# Altium schematic symbol library jlcpcb_2025_04_ferrites_extended_0603.schlib: 833 symbols (part 3 of 4)
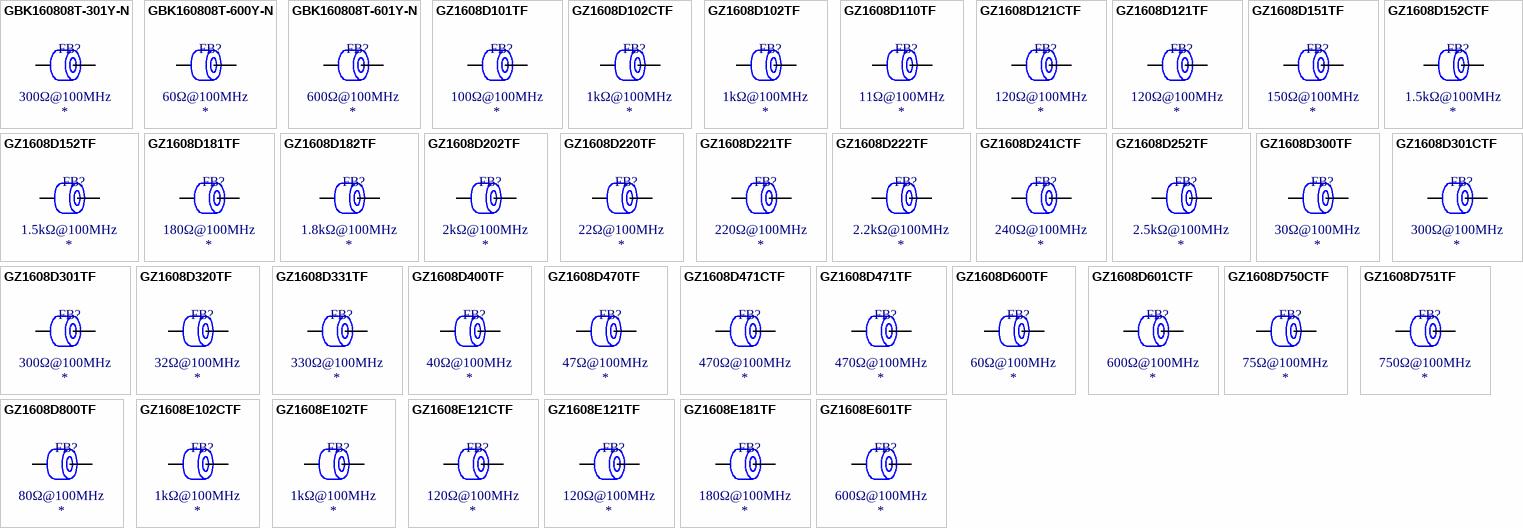
[diagram p22: symbols GBK160808T-301Y-N to GZ1608E601TF]

## GZ1608D182TF
designator FB?  Impedance @ Frequency: 1.8kΩ@100MHz
Ferrite, 1.8kΩ@100MHz, ±25%, 900mΩ, 100mA, SMD 0603; Manufacturer: Sunlord; Manufacturer Part Number: GZ1608D182TF; Package Size: 0603; JLCPCB Basic Part: No; JLCPCB Part Number: C96695; Supplier 1: LCSC; Category: Ferrite Beads; Supplier Part Number 1: C96695; Tolerance: ±25%; Rated Current: 100mA; DC Resistance: 900mΩ; RoHS: Yes; ComponentLink1Description: Datasheet; ComponentLink1URL: https://wmsc.lcsc.com/wmsc/upload/file/pdf/v2/lcsc/2310301640_Sunlord-GZ1608D182TF_C96695.pdf; ComponentLink2Description: JLCPCB Part URL; ComponentLink2URL: https://jlcpcb.com/partdetail/C96695; ComponentLink3Description: LCSC Part URL; ComponentLink3URL: https://lcsc.com/product-detail/Ferrite-Beads_Sunlord-Sunlord-GZ1608D182TF_C96695.html
footprint FB-0603 (0603 (1608M) Ferrite)
pins: 1, 2

## GZ1608D202TF
designator FB?  Impedance @ Frequency: 2kΩ@100MHz
Ferrite, 2kΩ@100MHz, ±25%, 1.2Ω, 100mA, SMD 0603; Manufacturer: Sunlord; Manufacturer Part Number: GZ1608D202TF; Package Size: 0603; JLCPCB Basic Part: No; JLCPCB Part Number: C96696; Supplier 1: LCSC; Category: Ferrite Beads; Supplier Part Number 1: C96696; Tolerance: ±25%; Rated Current: 100mA; DC Resistance: 1.2Ω; RoHS: Yes; ComponentLink1Description: Datasheet; ComponentLink1URL: https://wmsc.lcsc.com/wmsc/upload/file/pdf/v2/lcsc/2310301640_Sunlord-GZ1608D202TF_C96696.pdf; ComponentLink2Description: JLCPCB Part URL; ComponentLink2URL: https://jlcpcb.com/partdetail/C96696; ComponentLink3Description: LCSC Part URL; ComponentLink3URL: https://lcsc.com/product-detail/Ferrite-Beads_Sunlord-Sunlord-GZ1608D202TF_C96696.html
footprint FB-0603 (0603 (1608M) Ferrite)
pins: 1, 2

## GZ1608D220TF
designator FB?  Impedance @ Frequency: 22Ω@100MHz
Ferrite, 22Ω@100MHz, ±25%, SMD 0603; Manufacturer: Sunlord; Manufacturer Part Number: GZ1608D220TF; Package Size: 0603; JLCPCB Basic Part: No; JLCPCB Part Number: C1010; Supplier 1: LCSC; Category: Ferrite Beads; Supplier Part Number 1: C1010; Tolerance: ±25%; RoHS: Yes; ComponentLink1Description: Datasheet; ComponentLink1URL: https://wmsc.lcsc.com/wmsc/upload/file/pdf/v2/lcsc/2310301640_Sunlord-GZ1608D220TF_C1010.pdf; ComponentLink2Description: JLCPCB Part URL; ComponentLink2URL: https://jlcpcb.com/partdetail/C1010; ComponentLink3Description: LCSC Part URL; ComponentLink3URL: https://lcsc.com/product-detail/Ferrite-Beads_Sunlord-Sunlord-GZ1608D220TF_C1010.html
pins: 1, 2

## GZ1608D221TF
designator FB?  Impedance @ Frequency: 220Ω@100MHz
Ferrite, 220Ω@100MHz, ±25%, 300mΩ, 300mA, SMD 0603; Manufacturer: Sunlord; Manufacturer Part Number: GZ1608D221TF; Package Size: 0603; JLCPCB Basic Part: No; JLCPCB Part Number: C66810; Supplier 1: LCSC; Category: Ferrite Beads; Supplier Part Number 1: C66810; Tolerance: ±25%; Rated Current: 300mA; DC Resistance: 300mΩ; RoHS: Yes; ComponentLink1Description: Datasheet; ComponentLink1URL: https://wmsc.lcsc.com/wmsc/upload/file/pdf/v2/lcsc/2310301640_Sunlord-GZ1608D221TF_C66810.pdf; ComponentLink2Description: JLCPCB Part URL; ComponentLink2URL: https://jlcpcb.com/partdetail/C66810; ComponentLink3Description: LCSC Part URL; ComponentLink3URL: https://lcsc.com/product-detail/Ferrite-Beads_Sunlord-Sunlord-GZ1608D221TF_C66810.html
footprint FB-0603 (0603 (1608M) Ferrite)
pins: 1, 2

## GZ1608D222TF
designator FB?  Impedance @ Frequency: 2.2kΩ@100MHz
Ferrite, 2.2kΩ@100MHz, ±25%, 1.2Ω, 100mA, SMD 0603; Manufacturer: Sunlord; Manufacturer Part Number: GZ1608D222TF; Package Size: 0603; JLCPCB Basic Part: No; JLCPCB Part Number: C96697; Supplier 1: LCSC; Category: Ferrite Beads; Supplier Part Number 1: C96697; Tolerance: ±25%; Rated Current: 100mA; DC Resistance: 1.2Ω; RoHS: Yes; ComponentLink1Description: Datasheet; ComponentLink1URL: https://wmsc.lcsc.com/wmsc/upload/file/pdf/v2/lcsc/2310301640_Sunlord-GZ1608D222TF_C96697.pdf; ComponentLink2Description: JLCPCB Part URL; ComponentLink2URL: https://jlcpcb.com/partdetail/C96697; ComponentLink3Description: LCSC Part URL; ComponentLink3URL: https://lcsc.com/product-detail/Ferrite-Beads_Sunlord-Sunlord-GZ1608D222TF_C96697.html
footprint FB-0603 (0603 (1608M) Ferrite)
pins: 1, 2

## GZ1608D241CTF
designator FB?  Impedance @ Frequency: 240Ω@100MHz
Ferrite, 240Ω@100MHz, ±25%, 300mΩ, 500mA, SMD 0603; Manufacturer: Sunlord; Manufacturer Part Number: GZ1608D241CTF; Package Size: 0603; JLCPCB Basic Part: No; JLCPCB Part Number: C361557; Supplier 1: LCSC; Category: Ferrite Beads; Supplier Part Number 1: C361557; Tolerance: ±25%; Rated Current: 500mA; DC Resistance: 300mΩ; RoHS: Yes; ComponentLink1Description: Datasheet; ComponentLink1URL: https://wmsc.lcsc.com/wmsc/upload/file/pdf/v2/lcsc/2310301640_Sunlord-GZ1608D241CTF_C361557.pdf; ComponentLink2Description: JLCPCB Part URL; ComponentLink2URL: https://jlcpcb.com/partdetail/C361557; ComponentLink3Description: LCSC Part URL; ComponentLink3URL: https://lcsc.com/product-detail/Ferrite-Beads_Sunlord-Sunlord-GZ1608D241CTF_C361557.html
footprint FB-0603 (0603 (1608M) Ferrite)
pins: 1, 2

## GZ1608D252TF
designator FB?  Impedance @ Frequency: 2.5kΩ@100MHz
Ferrite, 2.5kΩ@100MHz, 1.2Ω, SMD 0603; Manufacturer: Sunlord; Manufacturer Part Number: GZ1608D252TF; Package Size: 0603; JLCPCB Basic Part: No; JLCPCB Part Number: C369783; Supplier 1: LCSC; Category: Ferrite Beads; Supplier Part Number 1: C369783; DC Resistance: 1.2Ω; RoHS: Yes; ComponentLink1Description: Datasheet; ComponentLink1URL: https://wmsc.lcsc.com/wmsc/upload/file/pdf/v2/lcsc/2310301640_Sunlord-GZ1608D252TF_C369783.pdf; ComponentLink2Description: JLCPCB Part URL; ComponentLink2URL: https://jlcpcb.com/partdetail/C369783; ComponentLink3Description: LCSC Part URL; ComponentLink3URL: https://lcsc.com/product-detail/Ferrite-Beads_Sunlord-Sunlord-GZ1608D252TF_C369783.html
pins: 1, 2

## GZ1608D300TF
designator FB?  Impedance @ Frequency: 30Ω@100MHz
Ferrite, 30Ω@100MHz, ±25%, 50mΩ, 2A, SMD 0603; Manufacturer: Sunlord; Manufacturer Part Number: GZ1608D300TF; Package Size: 0603; JLCPCB Basic Part: No; JLCPCB Part Number: C24821; Supplier 1: LCSC; Category: Ferrite Beads; Supplier Part Number 1: C24821; Tolerance: ±25%; Rated Current: 2A; DC Resistance: 50mΩ; RoHS: Yes; ComponentLink1Description: Datasheet; ComponentLink1URL: https://wmsc.lcsc.com/wmsc/upload/file/pdf/v2/lcsc/2310301640_Sunlord-GZ1608D300TF_C24821.pdf; ComponentLink2Description: JLCPCB Part URL; ComponentLink2URL: https://jlcpcb.com/partdetail/C24821; ComponentLink3Description: LCSC Part URL; ComponentLink3URL: https://lcsc.com/product-detail/Ferrite-Beads_Sunlord-Sunlord-GZ1608D300TF_C24821.html
footprint FB-0603 (0603 (1608M) Ferrite)
pins: 1, 2

## GZ1608D301CTF
designator FB?  Impedance @ Frequency: 300Ω@100MHz
Ferrite, 300Ω@100MHz, ±25%, 350mΩ, 500mA, SMD 0603; Manufacturer: Sunlord; Manufacturer Part Number: GZ1608D301CTF; Package Size: 0603; JLCPCB Basic Part: No; JLCPCB Part Number: C98271; Supplier 1: LCSC; Category: Ferrite Beads; Supplier Part Number 1: C98271; Tolerance: ±25%; Rated Current: 500mA; DC Resistance: 350mΩ; RoHS: Yes; ComponentLink1Description: Datasheet; ComponentLink1URL: https://wmsc.lcsc.com/wmsc/upload/file/pdf/v2/lcsc/2310301640_Sunlord-GZ1608D301CTF_C98271.pdf; ComponentLink2Description: JLCPCB Part URL; ComponentLink2URL: https://jlcpcb.com/partdetail/C98271; ComponentLink3Description: LCSC Part URL; ComponentLink3URL: https://lcsc.com/product-detail/Ferrite-Beads_Sunlord-Sunlord-GZ1608D301CTF_C98271.html
footprint FB-0603 (0603 (1608M) Ferrite)
pins: 1, 2

## GZ1608D301TF
designator FB?  Impedance @ Frequency: 300Ω@100MHz
Ferrite, 300Ω@100MHz, ±25%, 350mΩ, 200mA, SMD 0603; Manufacturer: Sunlord; Manufacturer Part Number: GZ1608D301TF; Package Size: 0603; JLCPCB Basic Part: No; JLCPCB Part Number: C96698; Supplier 1: LCSC; Category: Ferrite Beads; Supplier Part Number 1: C96698; Tolerance: ±25%; Rated Current: 200mA; DC Resistance: 350mΩ; RoHS: Yes; ComponentLink1Description: Datasheet; ComponentLink1URL: https://wmsc.lcsc.com/wmsc/upload/file/pdf/v2/lcsc/2310301640_Sunlord-GZ1608D301TF_C96698.pdf; ComponentLink2Description: JLCPCB Part URL; ComponentLink2URL: https://jlcpcb.com/partdetail/C96698; ComponentLink3Description: LCSC Part URL; ComponentLink3URL: https://lcsc.com/product-detail/Ferrite-Beads_Sunlord-Sunlord-GZ1608D301TF_C96698.html
footprint FB-0603 (0603 (1608M) Ferrite)
pins: 1, 2

## GZ1608D320TF
designator FB?  Impedance @ Frequency: 32Ω@100MHz
Ferrite, 32Ω@100MHz, ±25%, SMD 0603; Manufacturer: Sunlord; Manufacturer Part Number: GZ1608D320TF; Package Size: 0603; JLCPCB Basic Part: No; JLCPCB Part Number: C74331; Supplier 1: LCSC; Category: Ferrite Beads; Supplier Part Number 1: C74331; Tolerance: ±25%; RoHS: Yes; ComponentLink1Description: Datasheet; ComponentLink1URL: https://wmsc.lcsc.com/wmsc/upload/file/pdf/v2/lcsc/2310301640_Sunlord-GZ1608D320TF_C74331.pdf; ComponentLink2Description: JLCPCB Part URL; ComponentLink2URL: https://jlcpcb.com/partdetail/C74331; ComponentLink3Description: LCSC Part URL; ComponentLink3URL: https://lcsc.com/product-detail/Ferrite-Beads_Sunlord-Sunlord-GZ1608D320TF_C74331.html
pins: 1, 2

## GZ1608D331TF
designator FB?  Impedance @ Frequency: 330Ω@100MHz
Ferrite, 330Ω@100MHz, ±25%, SMD 0603; Manufacturer: Sunlord; Manufacturer Part Number: GZ1608D331TF; Package Size: 0603; JLCPCB Basic Part: No; JLCPCB Part Number: C279917; Supplier 1: LCSC; Category: Ferrite Beads; Supplier Part Number 1: C279917; Tolerance: ±25%; RoHS: Yes; ComponentLink1Description: Datasheet; ComponentLink1URL: https://wmsc.lcsc.com/wmsc/upload/file/pdf/v2/lcsc/2310301640_Sunlord-GZ1608D331TF_C279917.pdf; ComponentLink2Description: JLCPCB Part URL; ComponentLink2URL: https://jlcpcb.com/partdetail/C279917; ComponentLink3Description: LCSC Part URL; ComponentLink3URL: https://lcsc.com/product-detail/Ferrite-Beads_Sunlord-Sunlord-GZ1608D331TF_C279917.html
pins: 1, 2

## GZ1608D400TF
designator FB?  Impedance @ Frequency: 40Ω@100MHz
Ferrite, 40Ω@100MHz, ±25%, SMD 0603; Manufacturer: Sunlord; Manufacturer Part Number: GZ1608D400TF; Package Size: 0603; JLCPCB Basic Part: No; JLCPCB Part Number: C919151; Supplier 1: LCSC; Category: Ferrite Beads; Supplier Part Number 1: C919151; Tolerance: ±25%; RoHS: Yes; ComponentLink1Description: Datasheet; ComponentLink1URL: https://wmsc.lcsc.com/wmsc/upload/file/pdf/v2/lcsc/2310301640_Sunlord-GZ1608D400TF_C919151.pdf; ComponentLink2Description: JLCPCB Part URL; ComponentLink2URL: https://jlcpcb.com/partdetail/C919151; ComponentLink3Description: LCSC Part URL; ComponentLink3URL: https://lcsc.com/product-detail/Ferrite-Beads_Sunlord-Sunlord-GZ1608D400TF_C919151.html
pins: 1, 2

## GZ1608D470TF
designator FB?  Impedance @ Frequency: 47Ω@100MHz
Ferrite, 47Ω@100MHz, ±25%, SMD 0603; Manufacturer: Sunlord; Manufacturer Part Number: GZ1608D470TF; Package Size: 0603; JLCPCB Basic Part: No; JLCPCB Part Number: C83207; Supplier 1: LCSC; Category: Ferrite Beads; Supplier Part Number 1: C83207; Tolerance: ±25%; RoHS: Yes; ComponentLink1Description: Datasheet; ComponentLink1URL: https://wmsc.lcsc.com/wmsc/upload/file/pdf/v2/lcsc/2310301640_Sunlord-GZ1608D470TF_C83207.pdf; ComponentLink2Description: JLCPCB Part URL; ComponentLink2URL: https://jlcpcb.com/partdetail/C83207; ComponentLink3Description: LCSC Part URL; ComponentLink3URL: https://lcsc.com/product-detail/Ferrite-Beads_Sunlord-Sunlord-GZ1608D470TF_C83207.html
pins: 1, 2

## GZ1608D471CTF
designator FB?  Impedance @ Frequency: 470Ω@100MHz
Ferrite, 470Ω@100MHz, ±25%, 400mΩ, 500mA, SMD 0603; Manufacturer: Sunlord; Manufacturer Part Number: GZ1608D471CTF; Package Size: 0603; JLCPCB Basic Part: No; JLCPCB Part Number: C98272; Supplier 1: LCSC; Category: Ferrite Beads; Supplier Part Number 1: C98272; Tolerance: ±25%; Rated Current: 500mA; DC Resistance: 400mΩ; RoHS: Yes; ComponentLink1Description: Datasheet; ComponentLink1URL: https://wmsc.lcsc.com/wmsc/upload/file/pdf/v2/lcsc/2310301640_Sunlord-GZ1608D471CTF_C98272.pdf; ComponentLink2Description: JLCPCB Part URL; ComponentLink2URL: https://jlcpcb.com/partdetail/C98272; ComponentLink3Description: LCSC Part URL; ComponentLink3URL: https://lcsc.com/product-detail/Ferrite-Beads_Sunlord-Sunlord-GZ1608D471CTF_C98272.html
footprint FB-0603 (0603 (1608M) Ferrite)
pins: 1, 2

## GZ1608D471TF
designator FB?  Impedance @ Frequency: 470Ω@100MHz
Ferrite, 470Ω@100MHz, ±25%, 450mΩ, 200mA, SMD 0603; Manufacturer: Sunlord; Manufacturer Part Number: GZ1608D471TF; Package Size: 0603; JLCPCB Basic Part: No; JLCPCB Part Number: C89921; Supplier 1: LCSC; Category: Ferrite Beads; Supplier Part Number 1: C89921; Tolerance: ±25%; Rated Current: 200mA; DC Resistance: 450mΩ; RoHS: Yes; ComponentLink1Description: Datasheet; ComponentLink1URL: https://wmsc.lcsc.com/wmsc/upload/file/pdf/v2/lcsc/2310301640_Sunlord-GZ1608D471TF_C89921.pdf; ComponentLink2Description: JLCPCB Part URL; ComponentLink2URL: https://jlcpcb.com/partdetail/C89921; ComponentLink3Description: LCSC Part URL; ComponentLink3URL: https://lcsc.com/product-detail/Ferrite-Beads_Sunlord-Sunlord-GZ1608D471TF_C89921.html
footprint FB-0603 (0603 (1608M) Ferrite)
pins: 1, 2

## GZ1608D600TF
designator FB?  Impedance @ Frequency: 60Ω@100MHz
Ferrite, 60Ω@100MHz, ±25%, 100mΩ, 500mA, SMD 0603; Manufacturer: Sunlord; Manufacturer Part Number: GZ1608D600TF; Package Size: 0603; JLCPCB Basic Part: No; JLCPCB Part Number: C35327; Supplier 1: LCSC; Category: Ferrite Beads; Supplier Part Number 1: C35327; Tolerance: ±25%; Rated Current: 500mA; DC Resistance: 100mΩ; RoHS: Yes; ComponentLink1Description: Datasheet; ComponentLink1URL: https://wmsc.lcsc.com/wmsc/upload/file/pdf/v2/lcsc/2310301640_Sunlord-GZ1608D600TF_C35327.pdf; ComponentLink2Description: JLCPCB Part URL; ComponentLink2URL: https://jlcpcb.com/partdetail/C35327; ComponentLink3Description: LCSC Part URL; ComponentLink3URL: https://lcsc.com/product-detail/Ferrite-Beads_Sunlord-Sunlord-GZ1608D600TF_C35327.html
footprint FB-0603 (0603 (1608M) Ferrite)
pins: 1, 2

## GZ1608D601CTF
designator FB?  Impedance @ Frequency: 600Ω@100MHz
Ferrite, 600Ω@100MHz, ±25%, 400mΩ, 500mA, SMD 0603; Manufacturer: Sunlord; Manufacturer Part Number: GZ1608D601CTF; Package Size: 0603; JLCPCB Basic Part: No; JLCPCB Part Number: C74330; Supplier 1: LCSC; Category: Ferrite Beads; Supplier Part Number 1: C74330; Tolerance: ±25%; Rated Current: 500mA; DC Resistance: 400mΩ; RoHS: Yes; ComponentLink1Description: Datasheet; ComponentLink1URL: https://wmsc.lcsc.com/wmsc/upload/file/pdf/v2/lcsc/2310301640_Sunlord-GZ1608D601CTF_C74330.pdf; ComponentLink2Description: JLCPCB Part URL; ComponentLink2URL: https://jlcpcb.com/partdetail/C74330; ComponentLink3Description: LCSC Part URL; ComponentLink3URL: https://lcsc.com/product-detail/Ferrite-Beads_Sunlord-Sunlord-GZ1608D601CTF_C74330.html
footprint FB-0603 (0603 (1608M) Ferrite)
pins: 1, 2

## GZ1608D750CTF
designator FB?  Impedance @ Frequency: 75Ω@100MHz
Ferrite, 75Ω@100MHz, ±25%, SMD 0603; Manufacturer: Sunlord; Manufacturer Part Number: GZ1608D750CTF; Package Size: 0603; JLCPCB Basic Part: No; JLCPCB Part Number: C279841; Supplier 1: LCSC; Category: Ferrite Beads; Supplier Part Number 1: C279841; Tolerance: ±25%; RoHS: Yes; ComponentLink1Description: Datasheet; ComponentLink1URL: https://wmsc.lcsc.com/wmsc/upload/file/pdf/v2/lcsc/2310301640_Sunlord-GZ1608D750CTF_C279841.pdf; ComponentLink2Description: JLCPCB Part URL; ComponentLink2URL: https://jlcpcb.com/partdetail/C279841; ComponentLink3Description: LCSC Part URL; ComponentLink3URL: https://lcsc.com/product-detail/Ferrite-Beads_Sunlord-Sunlord-GZ1608D750CTF_C279841.html
pins: 1, 2

## GZ1608D751TF
designator FB?  Impedance @ Frequency: 750Ω@100MHz
Ferrite, 750Ω@100MHz, ±25%, 500mΩ, 200mA, SMD 0603; Manufacturer: Sunlord; Manufacturer Part Number: GZ1608D751TF; Package Size: 0603; JLCPCB Basic Part: No; JLCPCB Part Number: C96699; Supplier 1: LCSC; Category: Ferrite Beads; Supplier Part Number 1: C96699; Tolerance: ±25%; Rated Current: 200mA; DC Resistance: 500mΩ; RoHS: Yes; ComponentLink1Description: Datasheet; ComponentLink1URL: https://wmsc.lcsc.com/wmsc/upload/file/pdf/v2/lcsc/2310301640_Sunlord-GZ1608D751TF_C96699.pdf; ComponentLink2Description: JLCPCB Part URL; ComponentLink2URL: https://jlcpcb.com/partdetail/C96699; ComponentLink3Description: LCSC Part URL; ComponentLink3URL: https://lcsc.com/product-detail/Ferrite-Beads_Sunlord-Sunlord-GZ1608D751TF_C96699.html
footprint FB-0603 (0603 (1608M) Ferrite)
pins: 1, 2

## GZ1608D800TF
designator FB?  Impedance @ Frequency: 80Ω@100MHz
Ferrite, 80Ω@100MHz, ±25%, 150mΩ, 400mA, SMD 0603; Manufacturer: Sunlord; Manufacturer Part Number: GZ1608D800TF; Package Size: 0603; JLCPCB Basic Part: No; JLCPCB Part Number: C96700; Supplier 1: LCSC; Category: Ferrite Beads; Supplier Part Number 1: C96700; Tolerance: ±25%; Rated Current: 400mA; DC Resistance: 150mΩ; RoHS: Yes; ComponentLink1Description: Datasheet; ComponentLink1URL: https://wmsc.lcsc.com/wmsc/upload/file/pdf/v2/lcsc/2310301640_Sunlord-GZ1608D800TF_C96700.pdf; ComponentLink2Description: JLCPCB Part URL; ComponentLink2URL: https://jlcpcb.com/partdetail/C96700; ComponentLink3Description: LCSC Part URL; ComponentLink3URL: https://lcsc.com/product-detail/Ferrite-Beads_Sunlord-Sunlord-GZ1608D800TF_C96700.html
footprint FB-0603 (0603 (1608M) Ferrite)
pins: 1, 2

## GZ1608E102CTF
designator FB?  Impedance @ Frequency: 1kΩ@100MHz
Ferrite, 1kΩ@100MHz, ±25%, 500mΩ, 400mA, SMD 0603; Manufacturer: Sunlord; Manufacturer Part Number: GZ1608E102CTF; Package Size: 0603; JLCPCB Basic Part: No; JLCPCB Part Number: C361559; Supplier 1: LCSC; Category: Ferrite Beads; Supplier Part Number 1: C361559; Tolerance: ±25%; Rated Current: 400mA; DC Resistance: 500mΩ; RoHS: Yes; ComponentLink1Description: Datasheet; ComponentLink1URL: https://wmsc.lcsc.com/wmsc/upload/file/pdf/v2/lcsc/2310301640_Sunlord-GZ1608E102CTF_C361559.pdf; ComponentLink2Description: JLCPCB Part URL; ComponentLink2URL: https://jlcpcb.com/partdetail/C361559; ComponentLink3Description: LCSC Part URL; ComponentLink3URL: https://lcsc.com/product-detail/Ferrite-Beads_Sunlord-Sunlord-GZ1608E102CTF_C361559.html
footprint FB-0603 (0603 (1608M) Ferrite)
pins: 1, 2

## GZ1608E102TF
designator FB?  Impedance @ Frequency: 1kΩ@100MHz
Ferrite, 1kΩ@100MHz, ±25%, 600mΩ, 200mA, SMD 0603; Manufacturer: Sunlord; Manufacturer Part Number: GZ1608E102TF; Package Size: 0603; JLCPCB Basic Part: No; JLCPCB Part Number: C361518; Supplier 1: LCSC; Category: Ferrite Beads; Supplier Part Number 1: C361518; Tolerance: ±25%; Rated Current: 200mA; DC Resistance: 600mΩ; RoHS: Yes; ComponentLink1Description: Datasheet; ComponentLink1URL: https://wmsc.lcsc.com/wmsc/upload/file/pdf/v2/lcsc/2310301640_Sunlord-GZ1608E102TF_C361518.pdf; ComponentLink2Description: JLCPCB Part URL; ComponentLink2URL: https://jlcpcb.com/partdetail/C361518; ComponentLink3Description: LCSC Part URL; ComponentLink3URL: https://lcsc.com/product-detail/Ferrite-Beads_Sunlord-Sunlord-GZ1608E102TF_C361518.html
footprint FB-0603 (0603 (1608M) Ferrite)
pins: 1, 2

## GZ1608E121CTF
designator FB?  Impedance @ Frequency: 120Ω@100MHz
Ferrite, 120Ω@100MHz, ±25%, 200mΩ, 500mA, SMD 0603; Manufacturer: Sunlord; Manufacturer Part Number: GZ1608E121CTF; Package Size: 0603; JLCPCB Basic Part: No; JLCPCB Part Number: C361558; Supplier 1: LCSC; Category: Ferrite Beads; Supplier Part Number 1: C361558; Tolerance: ±25%; Rated Current: 500mA; DC Resistance: 200mΩ; RoHS: Yes; ComponentLink1Description: Datasheet; ComponentLink1URL: https://wmsc.lcsc.com/wmsc/upload/file/pdf/v2/lcsc/2310301640_Sunlord-GZ1608E121CTF_C361558.pdf; ComponentLink2Description: JLCPCB Part URL; ComponentLink2URL: https://jlcpcb.com/partdetail/C361558; ComponentLink3Description: LCSC Part URL; ComponentLink3URL: https://lcsc.com/product-detail/Ferrite-Beads_Sunlord-Sunlord-GZ1608E121CTF_C361558.html
footprint FB-0603 (0603 (1608M) Ferrite)
pins: 1, 2

## GZ1608E121TF
designator FB?  Impedance @ Frequency: 120Ω@100MHz
Ferrite, 120Ω@100MHz, ±25%, 200mΩ, 300mA, SMD 0603; Manufacturer: Sunlord; Manufacturer Part Number: GZ1608E121TF; Package Size: 0603; JLCPCB Basic Part: No; JLCPCB Part Number: C98265; Supplier 1: LCSC; Category: Ferrite Beads; Supplier Part Number 1: C98265; Tolerance: ±25%; Rated Current: 300mA; DC Resistance: 200mΩ; RoHS: Yes; ComponentLink1Description: Datasheet; ComponentLink1URL: https://wmsc.lcsc.com/wmsc/upload/file/pdf/v2/lcsc/2310301640_Sunlord-GZ1608E121TF_C98265.pdf; ComponentLink2Description: JLCPCB Part URL; ComponentLink2URL: https://jlcpcb.com/partdetail/C98265; ComponentLink3Description: LCSC Part URL; ComponentLink3URL: https://lcsc.com/product-detail/Ferrite-Beads_Sunlord-Sunlord-GZ1608E121TF_C98265.html
footprint FB-0603 (0603 (1608M) Ferrite)
pins: 1, 2

## GZ1608E181TF
designator FB?  Impedance @ Frequency: 180Ω@100MHz
Ferrite, 180Ω@100MHz, ±25%, 300mΩ, 300mA, SMD 0603; Manufacturer: Sunlord; Manufacturer Part Number: GZ1608E181TF; Package Size: 0603; JLCPCB Basic Part: No; JLCPCB Part Number: C279915; Supplier 1: LCSC; Category: Ferrite Beads; Supplier Part Number 1: C279915; Tolerance: ±25%; Rated Current: 300mA; DC Resistance: 300mΩ; RoHS: Yes; ComponentLink1Description: Datasheet; ComponentLink1URL: https://wmsc.lcsc.com/wmsc/upload/file/pdf/v2/lcsc/2310301640_Sunlord-GZ1608E181TF_C279915.pdf; ComponentLink2Description: JLCPCB Part URL; ComponentLink2URL: https://jlcpcb.com/partdetail/C279915; ComponentLink3Description: LCSC Part URL; ComponentLink3URL: https://lcsc.com/product-detail/Ferrite-Beads_Sunlord-Sunlord-GZ1608E181TF_C279915.html
footprint FB-0603 (0603 (1608M) Ferrite)
pins: 1, 2

## GZ1608E601TF
designator FB?  Impedance @ Frequency: 600Ω@100MHz
Ferrite, 600Ω@100MHz, ±25%, 450mΩ, 200mA, SMD 0603; Manufacturer: Sunlord; Manufacturer Part Number: GZ1608E601TF; Package Size: 0603; JLCPCB Basic Part: No; JLCPCB Part Number: C361517; Supplier 1: LCSC; Category: Ferrite Beads; Supplier Part Number 1: C361517; Tolerance: ±25%; Rated Current: 200mA; DC Resistance: 450mΩ; RoHS: Yes; ComponentLink1Description: Datasheet; ComponentLink1URL: https://wmsc.lcsc.com/wmsc/upload/file/pdf/v2/lcsc/2310301640_Sunlord-GZ1608E601TF_C361517.pdf; ComponentLink2Description: JLCPCB Part URL; ComponentLink2URL: https://jlcpcb.com/partdetail/C361517; ComponentLink3Description: LCSC Part URL; ComponentLink3URL: https://lcsc.com/product-detail/Ferrite-Beads_Sunlord-Sunlord-GZ1608E601TF_C361517.html
footprint FB-0603 (0603 (1608M) Ferrite)
pins: 1, 2

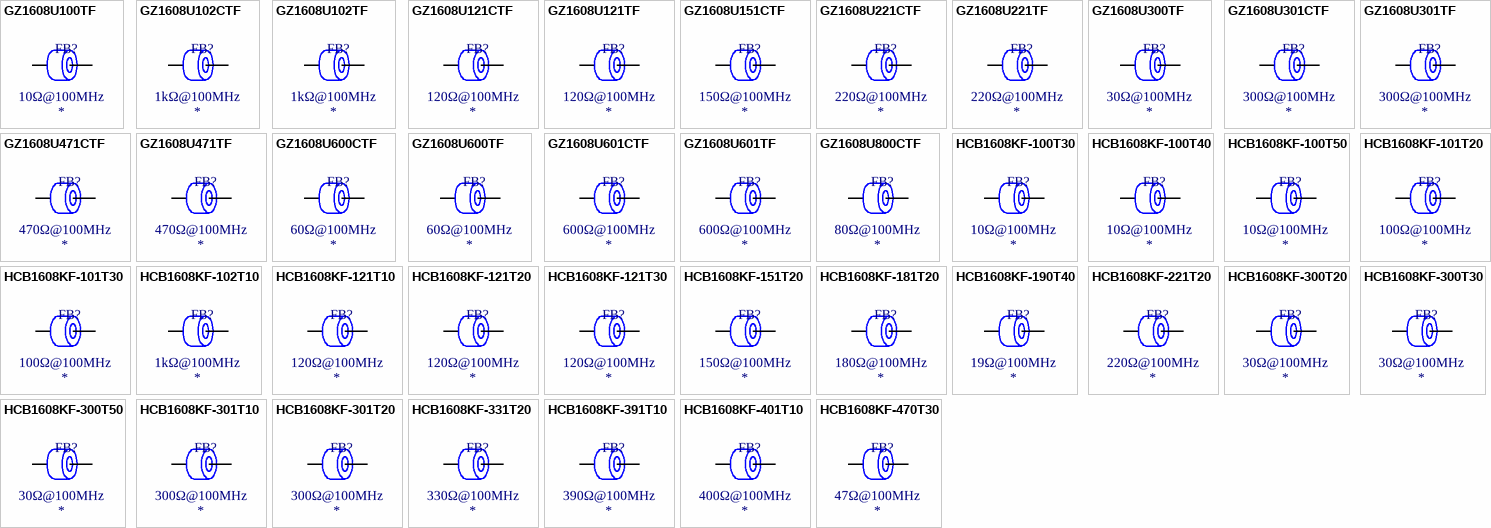
[diagram p11: symbols GZ1608U100TF to HCB1608KF-470T30]

## GZ1608U100TF
designator FB?  Impedance @ Frequency: 10Ω@100MHz
Ferrite, 10Ω@100MHz, 50mΩ, 2A, SMD 0603; Manufacturer: Sunlord; Manufacturer Part Number: GZ1608U100TF; Package Size: 0603; JLCPCB Basic Part: No; JLCPCB Part Number: C361519; Supplier 1: LCSC; Category: Ferrite Beads; Supplier Part Number 1: C361519; Rated Current: 2A; DC Resistance: 50mΩ; RoHS: Yes; ComponentLink1Description: Datasheet; ComponentLink1URL: https://wmsc.lcsc.com/wmsc/upload/file/pdf/v2/lcsc/2310301640_Sunlord-GZ1608U100TF_C361519.pdf; ComponentLink2Description: JLCPCB Part URL; ComponentLink2URL: https://jlcpcb.com/partdetail/C361519; ComponentLink3Description: LCSC Part URL; ComponentLink3URL: https://lcsc.com/product-detail/Ferrite-Beads_Sunlord-Sunlord-GZ1608U100TF_C361519.html
pins: 1, 2

## GZ1608U102CTF
designator FB?  Impedance @ Frequency: 1kΩ@100MHz
Ferrite, 1kΩ@100MHz, ±25%, 500mΩ, 400mA, SMD 0603; Manufacturer: Sunlord; Manufacturer Part Number: GZ1608U102CTF; Package Size: 0603; JLCPCB Basic Part: No; JLCPCB Part Number: C96701; Supplier 1: LCSC; Category: Ferrite Beads; Supplier Part Number 1: C96701; Tolerance: ±25%; Rated Current: 400mA; DC Resistance: 500mΩ; RoHS: Yes; ComponentLink1Description: Datasheet; ComponentLink1URL: https://wmsc.lcsc.com/wmsc/upload/file/pdf/v2/lcsc/2310301640_Sunlord-GZ1608U102CTF_C96701.pdf; ComponentLink2Description: JLCPCB Part URL; ComponentLink2URL: https://jlcpcb.com/partdetail/C96701; ComponentLink3Description: LCSC Part URL; ComponentLink3URL: https://lcsc.com/product-detail/Ferrite-Beads_Sunlord-Sunlord-GZ1608U102CTF_C96701.html
footprint FB-0603 (0603 (1608M) Ferrite)
pins: 1, 2

## GZ1608U102TF
designator FB?  Impedance @ Frequency: 1kΩ@100MHz
Ferrite, 1kΩ@100MHz, ±25%, 600mΩ, 200mA, SMD 0603; Manufacturer: Sunlord; Manufacturer Part Number: GZ1608U102TF; Package Size: 0603; JLCPCB Basic Part: No; JLCPCB Part Number: C279903; Supplier 1: LCSC; Category: Ferrite Beads; Supplier Part Number 1: C279903; Tolerance: ±25%; Rated Current: 200mA; DC Resistance: 600mΩ; RoHS: Yes; ComponentLink1Description: Datasheet; ComponentLink1URL: https://wmsc.lcsc.com/wmsc/upload/file/pdf/v2/lcsc/2310301640_Sunlord-GZ1608U102TF_C279903.pdf; ComponentLink2Description: JLCPCB Part URL; ComponentLink2URL: https://jlcpcb.com/partdetail/C279903; ComponentLink3Description: LCSC Part URL; ComponentLink3URL: https://lcsc.com/product-detail/Ferrite-Beads_Sunlord-Sunlord-GZ1608U102TF_C279903.html
footprint FB-0603 (0603 (1608M) Ferrite)
pins: 1, 2

## GZ1608U121CTF
designator FB?  Impedance @ Frequency: 120Ω@100MHz
Ferrite, 120Ω@100MHz, ±25%, 180mΩ, 500mA, SMD 0603; Manufacturer: Sunlord; Manufacturer Part Number: GZ1608U121CTF; Package Size: 0603; JLCPCB Basic Part: No; JLCPCB Part Number: C96702; Supplier 1: LCSC; Category: Ferrite Beads; Supplier Part Number 1: C96702; Tolerance: ±25%; Rated Current: 500mA; DC Resistance: 180mΩ; RoHS: Yes; ComponentLink1Description: Datasheet; ComponentLink1URL: https://wmsc.lcsc.com/wmsc/upload/file/pdf/v2/lcsc/2310301640_Sunlord-GZ1608U121CTF_C96702.pdf; ComponentLink2Description: JLCPCB Part URL; ComponentLink2URL: https://jlcpcb.com/partdetail/C96702; ComponentLink3Description: LCSC Part URL; ComponentLink3URL: https://lcsc.com/product-detail/Ferrite-Beads_Sunlord-Sunlord-GZ1608U121CTF_C96702.html
footprint FB-0603 (0603 (1608M) Ferrite)
pins: 1, 2

## GZ1608U121TF
designator FB?  Impedance @ Frequency: 120Ω@100MHz
Ferrite, 120Ω@100MHz, ±25%, 200mΩ, 300mA, SMD 0603; Manufacturer: Sunlord; Manufacturer Part Number: GZ1608U121TF; Package Size: 0603; JLCPCB Basic Part: No; JLCPCB Part Number: C304309; Supplier 1: LCSC; Category: Ferrite Beads; Supplier Part Number 1: C304309; Tolerance: ±25%; Rated Current: 300mA; DC Resistance: 200mΩ; RoHS: Yes; ComponentLink1Description: Datasheet; ComponentLink1URL: https://wmsc.lcsc.com/wmsc/upload/file/pdf/v2/lcsc/2310301640_Sunlord-GZ1608U121TF_C304309.pdf; ComponentLink2Description: JLCPCB Part URL; ComponentLink2URL: https://jlcpcb.com/partdetail/C304309; ComponentLink3Description: LCSC Part URL; ComponentLink3URL: https://lcsc.com/product-detail/Ferrite-Beads_Sunlord-Sunlord-GZ1608U121TF_C304309.html
footprint FB-0603 (0603 (1608M) Ferrite)
pins: 1, 2

## GZ1608U151CTF
designator FB?  Impedance @ Frequency: 150Ω@100MHz
Ferrite, 150Ω@100MHz, ±25%, 250mΩ, 500mA, SMD 0603; Manufacturer: Sunlord; Manufacturer Part Number: GZ1608U151CTF; Package Size: 0603; JLCPCB Basic Part: No; JLCPCB Part Number: C96703; Supplier 1: LCSC; Category: Ferrite Beads; Supplier Part Number 1: C96703; Tolerance: ±25%; Rated Current: 500mA; DC Resistance: 250mΩ; RoHS: Yes; ComponentLink1Description: Datasheet; ComponentLink1URL: https://wmsc.lcsc.com/wmsc/upload/file/pdf/v2/lcsc/2310301640_Sunlord-GZ1608U151CTF_C96703.pdf; ComponentLink2Description: JLCPCB Part URL; ComponentLink2URL: https://jlcpcb.com/partdetail/C96703; ComponentLink3Description: LCSC Part URL; ComponentLink3URL: https://lcsc.com/product-detail/Ferrite-Beads_Sunlord-Sunlord-GZ1608U151CTF_C96703.html
footprint FB-0603 (0603 (1608M) Ferrite)
pins: 1, 2

## GZ1608U221CTF
designator FB?  Impedance @ Frequency: 220Ω@100MHz
Ferrite, 220Ω@100MHz, ±25%, 250mΩ, 500mA, SMD 0603; Manufacturer: Sunlord; Manufacturer Part Number: GZ1608U221CTF; Package Size: 0603; JLCPCB Basic Part: No; JLCPCB Part Number: C96704; Supplier 1: LCSC; Category: Ferrite Beads; Supplier Part Number 1: C96704; Tolerance: ±25%; Rated Current: 500mA; DC Resistance: 250mΩ; RoHS: Yes; ComponentLink1Description: Datasheet; ComponentLink1URL: https://wmsc.lcsc.com/wmsc/upload/file/pdf/v2/lcsc/2310301640_Sunlord-GZ1608U221CTF_C96704.pdf; ComponentLink2Description: JLCPCB Part URL; ComponentLink2URL: https://jlcpcb.com/partdetail/C96704; ComponentLink3Description: LCSC Part URL; ComponentLink3URL: https://lcsc.com/product-detail/Ferrite-Beads_Sunlord-Sunlord-GZ1608U221CTF_C96704.html
footprint FB-0603 (0603 (1608M) Ferrite)
pins: 1, 2

## GZ1608U221TF
designator FB?  Impedance @ Frequency: 220Ω@100MHz
Ferrite, 220Ω@100MHz, ±25%, 300mΩ, 300mA, SMD 0603; Manufacturer: Sunlord; Manufacturer Part Number: GZ1608U221TF; Package Size: 0603; JLCPCB Basic Part: No; JLCPCB Part Number: C304310; Supplier 1: LCSC; Category: Ferrite Beads; Supplier Part Number 1: C304310; Tolerance: ±25%; Rated Current: 300mA; DC Resistance: 300mΩ; RoHS: Yes; ComponentLink1Description: Datasheet; ComponentLink1URL: https://wmsc.lcsc.com/wmsc/upload/file/pdf/v2/lcsc/2310301640_Sunlord-GZ1608U221TF_C304310.pdf; ComponentLink2Description: JLCPCB Part URL; ComponentLink2URL: https://jlcpcb.com/partdetail/C304310; ComponentLink3Description: LCSC Part URL; ComponentLink3URL: https://lcsc.com/product-detail/Ferrite-Beads_Sunlord-Sunlord-GZ1608U221TF_C304310.html
footprint FB-0603 (0603 (1608M) Ferrite)
pins: 1, 2

## GZ1608U300TF
designator FB?  Impedance @ Frequency: 30Ω@100MHz
Ferrite, 30Ω@100MHz, ±25%, 50mΩ, 2A, SMD 0603; Manufacturer: Sunlord; Manufacturer Part Number: GZ1608U300TF; Package Size: 0603; JLCPCB Basic Part: No; JLCPCB Part Number: C361520; Supplier 1: LCSC; Category: Ferrite Beads; Supplier Part Number 1: C361520; Tolerance: ±25%; Rated Current: 2A; DC Resistance: 50mΩ; RoHS: Yes; ComponentLink1Description: Datasheet; ComponentLink1URL: https://wmsc.lcsc.com/wmsc/upload/file/pdf/v2/lcsc/2310301640_Sunlord-GZ1608U300TF_C361520.pdf; ComponentLink2Description: JLCPCB Part URL; ComponentLink2URL: https://jlcpcb.com/partdetail/C361520; ComponentLink3Description: LCSC Part URL; ComponentLink3URL: https://lcsc.com/product-detail/Ferrite-Beads_Sunlord-Sunlord-GZ1608U300TF_C361520.html
footprint FB-0603 (0603 (1608M) Ferrite)
pins: 1, 2

## GZ1608U301CTF
designator FB?  Impedance @ Frequency: 300Ω@100MHz
Ferrite, 300Ω@100MHz, ±25%, 250mΩ, 500mA, SMD 0603; Manufacturer: Sunlord; Manufacturer Part Number: GZ1608U301CTF; Package Size: 0603; JLCPCB Basic Part: No; JLCPCB Part Number: C96705; Supplier 1: LCSC; Category: Ferrite Beads; Supplier Part Number 1: C96705; Tolerance: ±25%; Rated Current: 500mA; DC Resistance: 250mΩ; RoHS: Yes; ComponentLink1Description: Datasheet; ComponentLink1URL: https://wmsc.lcsc.com/wmsc/upload/file/pdf/v2/lcsc/2310301640_Sunlord-GZ1608U301CTF_C96705.pdf; ComponentLink2Description: JLCPCB Part URL; ComponentLink2URL: https://jlcpcb.com/partdetail/C96705; ComponentLink3Description: LCSC Part URL; ComponentLink3URL: https://lcsc.com/product-detail/Ferrite-Beads_Sunlord-Sunlord-GZ1608U301CTF_C96705.html
footprint FB-0603 (0603 (1608M) Ferrite)
pins: 1, 2

## GZ1608U301TF
designator FB?  Impedance @ Frequency: 300Ω@100MHz
Ferrite, 300Ω@100MHz, ±25%, 350mΩ, 200mA, SMD 0603; Manufacturer: Sunlord; Manufacturer Part Number: GZ1608U301TF; Package Size: 0603; JLCPCB Basic Part: No; JLCPCB Part Number: C361522; Supplier 1: LCSC; Category: Ferrite Beads; Supplier Part Number 1: C361522; Tolerance: ±25%; Rated Current: 200mA; DC Resistance: 350mΩ; RoHS: Yes; ComponentLink1Description: Datasheet; ComponentLink1URL: https://wmsc.lcsc.com/wmsc/upload/file/pdf/v2/lcsc/2310301640_Sunlord-GZ1608U301TF_C361522.pdf; ComponentLink2Description: JLCPCB Part URL; ComponentLink2URL: https://jlcpcb.com/partdetail/C361522; ComponentLink3Description: LCSC Part URL; ComponentLink3URL: https://lcsc.com/product-detail/Ferrite-Beads_Sunlord-Sunlord-GZ1608U301TF_C361522.html
footprint FB-0603 (0603 (1608M) Ferrite)
pins: 1, 2

## GZ1608U471CTF
designator FB?  Impedance @ Frequency: 470Ω@100MHz
Ferrite, 470Ω@100MHz, ±25%, 350mΩ, 500mA, SMD 0603; Manufacturer: Sunlord; Manufacturer Part Number: GZ1608U471CTF; Package Size: 0603; JLCPCB Basic Part: No; JLCPCB Part Number: C96706; Supplier 1: LCSC; Category: Ferrite Beads; Supplier Part Number 1: C96706; Tolerance: ±25%; Rated Current: 500mA; DC Resistance: 350mΩ; RoHS: Yes; ComponentLink1Description: Datasheet; ComponentLink1URL: https://wmsc.lcsc.com/wmsc/upload/file/pdf/v2/lcsc/2310301640_Sunlord-GZ1608U471CTF_C96706.pdf; ComponentLink2Description: JLCPCB Part URL; ComponentLink2URL: https://jlcpcb.com/partdetail/C96706; ComponentLink3Description: LCSC Part URL; ComponentLink3URL: https://lcsc.com/product-detail/Ferrite-Beads_Sunlord-Sunlord-GZ1608U471CTF_C96706.html
footprint FB-0603 (0603 (1608M) Ferrite)
pins: 1, 2

## GZ1608U471TF
designator FB?  Impedance @ Frequency: 470Ω@100MHz
Ferrite, 470Ω@100MHz, ±25%, 400mΩ, 200mA, SMD 0603; Manufacturer: Sunlord; Manufacturer Part Number: GZ1608U471TF; Package Size: 0603; JLCPCB Basic Part: No; JLCPCB Part Number: C361523; Supplier 1: LCSC; Category: Ferrite Beads; Supplier Part Number 1: C361523; Tolerance: ±25%; Rated Current: 200mA; DC Resistance: 400mΩ; RoHS: Yes; ComponentLink1Description: Datasheet; ComponentLink1URL: https://wmsc.lcsc.com/wmsc/upload/file/pdf/v2/lcsc/2310301640_Sunlord-GZ1608U471TF_C361523.pdf; ComponentLink2Description: JLCPCB Part URL; ComponentLink2URL: https://jlcpcb.com/partdetail/C361523; ComponentLink3Description: LCSC Part URL; ComponentLink3URL: https://lcsc.com/product-detail/Ferrite-Beads_Sunlord-Sunlord-GZ1608U471TF_C361523.html
footprint FB-0603 (0603 (1608M) Ferrite)
pins: 1, 2

## GZ1608U600CTF
designator FB?  Impedance @ Frequency: 60Ω@100MHz
Ferrite, 60Ω@100MHz, ±25%, 100mΩ, 800mA, SMD 0603; Manufacturer: Sunlord; Manufacturer Part Number: GZ1608U600CTF; Package Size: 0603; JLCPCB Basic Part: No; JLCPCB Part Number: C96707; Supplier 1: LCSC; Category: Ferrite Beads; Supplier Part Number 1: C96707; Tolerance: ±25%; Rated Current: 800mA; DC Resistance: 100mΩ; RoHS: Yes; ComponentLink1Description: Datasheet; ComponentLink1URL: https://wmsc.lcsc.com/wmsc/upload/file/pdf/v2/lcsc/2310301640_Sunlord-GZ1608U600CTF_C96707.pdf; ComponentLink2Description: JLCPCB Part URL; ComponentLink2URL: https://jlcpcb.com/partdetail/C96707; ComponentLink3Description: LCSC Part URL; ComponentLink3URL: https://lcsc.com/product-detail/Ferrite-Beads_Sunlord-Sunlord-GZ1608U600CTF_C96707.html
footprint FB-0603 (0603 (1608M) Ferrite)
pins: 1, 2

## GZ1608U600TF
designator FB?  Impedance @ Frequency: 60Ω@100MHz
Ferrite, 60Ω@100MHz, ±25%, 100mΩ, 500mA, SMD 0603; Manufacturer: Sunlord; Manufacturer Part Number: GZ1608U600TF; Package Size: 0603; JLCPCB Basic Part: No; JLCPCB Part Number: C361521; Supplier 1: LCSC; Category: Ferrite Beads; Supplier Part Number 1: C361521; Tolerance: ±25%; Rated Current: 500mA; DC Resistance: 100mΩ; RoHS: Yes; ComponentLink1Description: Datasheet; ComponentLink1URL: https://wmsc.lcsc.com/wmsc/upload/file/pdf/v2/lcsc/2310301640_Sunlord-GZ1608U600TF_C361521.pdf; ComponentLink2Description: JLCPCB Part URL; ComponentLink2URL: https://jlcpcb.com/partdetail/C361521; ComponentLink3Description: LCSC Part URL; ComponentLink3URL: https://lcsc.com/product-detail/Ferrite-Beads_Sunlord-Sunlord-GZ1608U600TF_C361521.html
footprint FB-0603 (0603 (1608M) Ferrite)
pins: 1, 2

## GZ1608U601CTF
designator FB?  Impedance @ Frequency: 600Ω@100MHz
Ferrite, 600Ω@100MHz, ±25%, 380mΩ, 500mA, SMD 0603; Manufacturer: Sunlord; Manufacturer Part Number: GZ1608U601CTF; Package Size: 0603; JLCPCB Basic Part: No; JLCPCB Part Number: C96708; Supplier 1: LCSC; Category: Ferrite Beads; Supplier Part Number 1: C96708; Tolerance: ±25%; Rated Current: 500mA; DC Resistance: 380mΩ; RoHS: Yes; ComponentLink1Description: Datasheet; ComponentLink1URL: https://wmsc.lcsc.com/wmsc/upload/file/pdf/v2/lcsc/2310301640_Sunlord-GZ1608U601CTF_C96708.pdf; ComponentLink2Description: JLCPCB Part URL; ComponentLink2URL: https://jlcpcb.com/partdetail/C96708; ComponentLink3Description: LCSC Part URL; ComponentLink3URL: https://lcsc.com/product-detail/Ferrite-Beads_Sunlord-Sunlord-GZ1608U601CTF_C96708.html
footprint FB-0603 (0603 (1608M) Ferrite)
pins: 1, 2

## GZ1608U601TF
designator FB?  Impedance @ Frequency: 600Ω@100MHz
Ferrite, 600Ω@100MHz, ±25%, 500mΩ, 200mA, SMD 0603; Manufacturer: Sunlord; Manufacturer Part Number: GZ1608U601TF; Package Size: 0603; JLCPCB Basic Part: No; JLCPCB Part Number: C361524; Supplier 1: LCSC; Category: Ferrite Beads; Supplier Part Number 1: C361524; Tolerance: ±25%; Rated Current: 200mA; DC Resistance: 500mΩ; RoHS: Yes; ComponentLink1Description: Datasheet; ComponentLink1URL: https://wmsc.lcsc.com/wmsc/upload/file/pdf/v2/lcsc/2310301640_Sunlord-GZ1608U601TF_C361524.pdf; ComponentLink2Description: JLCPCB Part URL; ComponentLink2URL: https://jlcpcb.com/partdetail/C361524; ComponentLink3Description: LCSC Part URL; ComponentLink3URL: https://lcsc.com/product-detail/Ferrite-Beads_Sunlord-Sunlord-GZ1608U601TF_C361524.html
footprint FB-0603 (0603 (1608M) Ferrite)
pins: 1, 2

## GZ1608U800CTF
designator FB?  Impedance @ Frequency: 80Ω@100MHz
Ferrite, 80Ω@100MHz, ±25%, 100mΩ, 600mA, SMD 0603; Manufacturer: Sunlord; Manufacturer Part Number: GZ1608U800CTF; Package Size: 0603; JLCPCB Basic Part: No; JLCPCB Part Number: C96709; Supplier 1: LCSC; Category: Ferrite Beads; Supplier Part Number 1: C96709; Tolerance: ±25%; Rated Current: 600mA; DC Resistance: 100mΩ; RoHS: Yes; ComponentLink1Description: Datasheet; ComponentLink1URL: https://wmsc.lcsc.com/wmsc/upload/file/pdf/v2/lcsc/2310301640_Sunlord-GZ1608U800CTF_C96709.pdf; ComponentLink2Description: JLCPCB Part URL; ComponentLink2URL: https://jlcpcb.com/partdetail/C96709; ComponentLink3Description: LCSC Part URL; ComponentLink3URL: https://lcsc.com/product-detail/Ferrite-Beads_Sunlord-Sunlord-GZ1608U800CTF_C96709.html
footprint FB-0603 (0603 (1608M) Ferrite)
pins: 1, 2

## HCB1608KF-100T30
designator FB?  Impedance @ Frequency: 10Ω@100MHz
Ferrite, 10Ω@100MHz, ±25%, 40mΩ, 3A, SMD 0603; Manufacturer: TAI-TECH; Manufacturer Part Number: HCB1608KF-100T30; Package Size: 0603; JLCPCB Basic Part: No; JLCPCB Part Number: C369510; Supplier 1: LCSC; Category: Ferrite Beads; Supplier Part Number 1: C369510; Tolerance: ±25%; Rated Current: 3A; DC Resistance: 40mΩ; RoHS: Yes; ComponentLink1Description: Datasheet; ComponentLink1URL: https://wmsc.lcsc.com/wmsc/upload/file/pdf/v2/lcsc/2009171441_TAI-TECH-HCB1608KF-100T30_C369510.pdf; ComponentLink2Description: JLCPCB Part URL; ComponentLink2URL: https://jlcpcb.com/partdetail/C369510; ComponentLink3Description: LCSC Part URL; ComponentLink3URL: https://lcsc.com/product-detail/Ferrite-Beads_TAI-TECH-TAI-TECH-HCB1608KF-100T30_C369510.html
footprint FB-0603 (0603 (1608M) Ferrite)
pins: 1, 2

## HCB1608KF-100T40
designator FB?  Impedance @ Frequency: 10Ω@100MHz
Ferrite, 10Ω@100MHz, ±25%, 30mΩ, 4A, SMD 0603; Manufacturer: TAI-TECH; Manufacturer Part Number: HCB1608KF-100T40; Package Size: 0603; JLCPCB Basic Part: No; JLCPCB Part Number: C369511; Supplier 1: LCSC; Category: Ferrite Beads; Supplier Part Number 1: C369511; Tolerance: ±25%; Rated Current: 4A; DC Resistance: 30mΩ; RoHS: Yes; ComponentLink1Description: Datasheet; ComponentLink1URL: https://wmsc.lcsc.com/wmsc/upload/file/pdf/v2/lcsc/2009171441_TAI-TECH-HCB1608KF-100T40_C369511.pdf; ComponentLink2Description: JLCPCB Part URL; ComponentLink2URL: https://jlcpcb.com/partdetail/C369511; ComponentLink3Description: LCSC Part URL; ComponentLink3URL: https://lcsc.com/product-detail/Ferrite-Beads_TAI-TECH-TAI-TECH-HCB1608KF-100T40_C369511.html
footprint FB-0603 (0603 (1608M) Ferrite)
pins: 1, 2

## HCB1608KF-100T50
designator FB?  Impedance @ Frequency: 10Ω@100MHz
Ferrite, 10Ω@100MHz, ±25%, 20mΩ, 5A, SMD 0603; Manufacturer: TAI-TECH; Manufacturer Part Number: HCB1608KF-100T50; Package Size: 0603; JLCPCB Basic Part: No; JLCPCB Part Number: C356963; Supplier 1: LCSC; Category: Ferrite Beads; Supplier Part Number 1: C356963; Tolerance: ±25%; Rated Current: 5A; DC Resistance: 20mΩ; RoHS: Yes; ComponentLink1Description: Datasheet; ComponentLink1URL: https://wmsc.lcsc.com/wmsc/upload/file/pdf/v2/lcsc/2009171138_TAI-TECH-HCB1608KF-100T50_C356963.pdf; ComponentLink2Description: JLCPCB Part URL; ComponentLink2URL: https://jlcpcb.com/partdetail/C356963; ComponentLink3Description: LCSC Part URL; ComponentLink3URL: https://lcsc.com/product-detail/Ferrite-Beads_TAI-TECH-TAI-TECH-HCB1608KF-100T50_C356963.html
footprint FB-0603 (0603 (1608M) Ferrite)
pins: 1, 2

## HCB1608KF-101T20
designator FB?  Impedance @ Frequency: 100Ω@100MHz
Ferrite, 100Ω@100MHz, ±25%, 200mΩ, 2A, SMD 0603; Manufacturer: TAI-TECH; Manufacturer Part Number: HCB1608KF-101T20; Package Size: 0603; JLCPCB Basic Part: No; JLCPCB Part Number: C369512; Supplier 1: LCSC; Category: Ferrite Beads; Supplier Part Number 1: C369512; Tolerance: ±25%; Rated Current: 2A; DC Resistance: 200mΩ; RoHS: Yes; ComponentLink1Description: Datasheet; ComponentLink1URL: https://wmsc.lcsc.com/wmsc/upload/file/pdf/v2/lcsc/2009171441_TAI-TECH-HCB1608KF-101T20_C369512.pdf; ComponentLink2Description: JLCPCB Part URL; ComponentLink2URL: https://jlcpcb.com/partdetail/C369512; ComponentLink3Description: LCSC Part URL; ComponentLink3URL: https://lcsc.com/product-detail/Ferrite-Beads_TAI-TECH-TAI-TECH-HCB1608KF-101T20_C369512.html
footprint FB-0603 (0603 (1608M) Ferrite)
pins: 1, 2

## HCB1608KF-101T30
designator FB?  Impedance @ Frequency: 100Ω@100MHz
Ferrite, 100Ω@100MHz, ±25%, 40mΩ, 3A, SMD 0603; Manufacturer: TAI-TECH; Manufacturer Part Number: HCB1608KF-101T30; Package Size: 0603; JLCPCB Basic Part: No; JLCPCB Part Number: C127292; Supplier 1: LCSC; Category: Ferrite Beads; Supplier Part Number 1: C127292; Tolerance: ±25%; Rated Current: 3A; DC Resistance: 40mΩ; RoHS: Yes; ComponentLink1Description: Datasheet; ComponentLink1URL: https://wmsc.lcsc.com/wmsc/upload/file/pdf/v2/lcsc/2009171134_TAI-TECH-HCB1608KF-101T30_C127292.pdf; ComponentLink2Description: JLCPCB Part URL; ComponentLink2URL: https://jlcpcb.com/partdetail/C127292; ComponentLink3Description: LCSC Part URL; ComponentLink3URL: https://lcsc.com/product-detail/Ferrite-Beads_TAI-TECH-TAI-TECH-HCB1608KF-101T30_C127292.html
footprint FB-0603 (0603 (1608M) Ferrite)
pins: 1, 2

## HCB1608KF-102T10
designator FB?  Impedance @ Frequency: 1kΩ@100MHz
Ferrite, 1kΩ@100MHz, ±25%, 200mΩ, 1A, SMD 0603; Manufacturer: TAI-TECH; Manufacturer Part Number: HCB1608KF-102T10; Package Size: 0603; JLCPCB Basic Part: No; JLCPCB Part Number: C304312; Supplier 1: LCSC; Category: Ferrite Beads; Supplier Part Number 1: C304312; Tolerance: ±25%; Rated Current: 1A; DC Resistance: 200mΩ; RoHS: Yes; ComponentLink1Description: Datasheet; ComponentLink1URL: https://wmsc.lcsc.com/wmsc/upload/file/pdf/v2/lcsc/2009171410_TAI-TECH-HCB1608KF-102T10_C304312.pdf; ComponentLink2Description: JLCPCB Part URL; ComponentLink2URL: https://jlcpcb.com/partdetail/C304312; ComponentLink3Description: LCSC Part URL; ComponentLink3URL: https://lcsc.com/product-detail/Ferrite-Beads_TAI-TECH-TAI-TECH-HCB1608KF-102T10_C304312.html
footprint FB-0603 (0603 (1608M) Ferrite)
pins: 1, 2

## HCB1608KF-121T10
designator FB?  Impedance @ Frequency: 120Ω@100MHz
Ferrite, 120Ω@100MHz, ±25%, 100mΩ, 1A, SMD 0603; Manufacturer: TAI-TECH; Manufacturer Part Number: HCB1608KF-121T10; Package Size: 0603; JLCPCB Basic Part: No; JLCPCB Part Number: C525675; Supplier 1: LCSC; Category: Ferrite Beads; Supplier Part Number 1: C525675; Tolerance: ±25%; Rated Current: 1A; DC Resistance: 100mΩ; RoHS: Yes; ComponentLink1Description: Datasheet; ComponentLink1URL: https://wmsc.lcsc.com/wmsc/upload/file/pdf/v2/lcsc/2009171443_TAI-TECH-HCB1608KF-121T10_C525675.pdf; ComponentLink2Description: JLCPCB Part URL; ComponentLink2URL: https://jlcpcb.com/partdetail/C525675; ComponentLink3Description: LCSC Part URL; ComponentLink3URL: https://lcsc.com/product-detail/Ferrite-Beads_TAI-TECH-TAI-TECH-HCB1608KF-121T10_C525675.html
footprint FB-0603 (0603 (1608M) Ferrite)
pins: 1, 2
